# Altium schematic symbol library Electronic Devices_LIB.SchLib: 703 symbols (part 7 of 8) (continued)
## RES_301K_1%_100mW_0402 (continued)
SMD Chip Resistor, 301 kOhm, ± 1%, 100 mW, 0402 [1005 Metric], Thick Film, Precision; Manufacturer: Panasonic; Power Rating: 100mW; Voltage Rating: 50V; Temperature Coefficient: 100ppm/°C; Supplier 1: Mouser; Manufacturer Part Number: ERJ-2RKF3013X; RoHS: Yes; Category: Chip SMD Resistors; Stock 1: 80695; Pricing 1: 1=0.1, 10=0.017, 50=0.017, 100=0.008, 1000=0.006, 10000=0.003 (USD); Mount: Surface Mount; Case Code (Metric): 1005; Case Code (Imperial): 0402; Contact Plating: Tin; Weight: 2.8E-05oz; Min Operating Temperature: -55°C; Max Operating Temperature: 155°C; Packaging: Tape and Reel; Package Quantity: 10000; Resistor Type: Thick Film; Number of Terminations: 2; Termination: SMD/SMT; Max Power Dissipation: 100mW; Voltage Rating (DC): 50V; Features: Automotive AEC-Q200; Series: ERJ; Resistance Tolerance: 1%; Length: 1mm; Width: 0.5mm; Height: 0.35mm; Ratings: AEC-Q200; RoHS Compliant: Yes; Reach SVHC Compliant: Unknown; Lead Free: 5697LeadFree; ComponentLink1URL: https://datasheet.ciiva.com/46388/426256-46388702.pdf?src-supplier=Element14; ComponentLink1Description: https://datasheet.ciiva.com/46388/426256-46388702.pdf?src-supplier=Element14; ComponentLink2URL: https://datasheet.ciiva.com/28531/1678782-28531429.pdf?src-supplier=Element14; ComponentLink2Description: https://datasheet.ciiva.com/28531/1678782-28531429.pdf?src-supplier=Element14; ComponentLink3URL: https://datasheet.ciiva.com/28683/1678782-28683161.pdf?src-supplier=Element14; ComponentLink3Description: https://datasheet.ciiva.com/28683/1678782-28683161.pdf?src-supplier=Element14; ComponentLink4URL: https://datasheet.ciiva.com/24161/aoa0000ce2-24161740.pdf?src-supplier=Mouser; ComponentLink4Description: https://datasheet.ciiva.com/24161/aoa0000ce2-24161740.pdf?src-supplier=Mouser; ComponentLink5URL: https://datasheet.ciiva.com/16771/70260748-16771500.pdf?src-supplier=Allied+Electronics; ComponentLink5Description: https://datasheet.ciiva.com/16771/70260748-16771500.pdf?src-supplier=Allied+Electronics; ComponentLink6URL: https://datasheet.ciiva.com/16780/70260748-16780326.pdf?src-supplier=Allied+Electronics; ComponentLink6Description: https://datasheet.ciiva.com/16780/70260748-16780326.pdf?src-supplier=Allied+Electronics; Supplier Part Number 1: 667-ERJ-2RKF3013X
footprint RES_0402_RESC1005X04N (Chip Resistor, 2-Leads, Body 1.02x0.53mm, IPC Medium Density)
pins: 1, 2

## RES_316K_1%_100mW_0402
designator R?, comment Tolerance: 1%  Resistance: 316K  Case/Package: 0402  (hidden comment: ERJ-2RKF3163X)
SMD Chip Resistor, 316 kOhm, ± 1%, 100 mW, 0402 [1005 Metric], Thick Film, Precision; Manufacturer: Panasonic; Power Rating: 100mW; Voltage Rating: 50V; Temperature Coefficient: 100ppm/°C; Supplier 1: Digikey; Manufacturer Part Number: ERJ-2RKF3163X; RoHS: Yes; Category: Chip SMD Resistors; Stock 1: 118400; Pricing 1: 1=0.1, 10=0.024, 50=0.0152, 100=0.0127, 500=0.00866, 1000=0.00746, 5000=0.00542, 10000=0.0048, 20000=0.00429, 30000=0.00402, 50000=0.00373, 100000=0.0034 (USD); Mount: Surface Mount; Case Code (Metric): 1005; Case Code (Imperial): 0402; Contact Plating: Tin; Min Operating Temperature: -55°C; Max Operating Temperature: 155°C; Packaging: Tape and Reel; Package Quantity: 1; Resistor Type: Thick Film; Number of Terminations: 2; Termination: SMD/SMT; Max Power Dissipation: 100mW; Voltage Rating (DC): 50V; Features: Automotive AEC-Q200; Series: ERJ; Resistance Tolerance: 1%; Length: 0.039inch; Width: 0.5mm; Height: 0.016inch; Ratings: AEC-Q200; Reach SVHC Compliant: No; Lead Free: Lead Free; RoHS Compliant: Yes; ComponentLink1URL: https://datasheet.ciiva.com/22663/1678782-22663805.pdf?src-supplier=Farnell; ComponentLink1Description: https://datasheet.ciiva.com/22663/1678782-22663805.pdf?src-supplier=Farnell; ComponentLink2URL: https://datasheet.ciiva.com/43467/1678782-43467525.pdf?src-supplier=Farnell; ComponentLink2Description: https://datasheet.ciiva.com/43467/1678782-43467525.pdf?src-supplier=Farnell; ComponentLink3URL: https://datasheet.ciiva.com/9183/aoa0000ce2-9183095.pdf?src-supplier=Avnet; ComponentLink3Description: https://datasheet.ciiva.com/9183/aoa0000ce2-9183095.pdf?src-supplier=Avnet; ComponentLink4URL: https://datasheet.ciiva.com/30180/aoa0000ce2-30180486.pdf?src-supplier=Onlinecomponents.com; ComponentLink4Description: https://datasheet.ciiva.com/30180/aoa0000ce2-30180486.pdf?src-supplier=Onlinecomponents.com; ComponentLink5URL: https://datasheet.ciiva.com/16761/70260748-16761806.pdf?src-supplier=Allied+Electronics; ComponentLink5Description: https://datasheet.ciiva.com/16761/70260748-16761806.pdf?src-supplier=Allied+Electronics; ComponentLink6URL: https://datasheet.ciiva.com/16762/70260748-16762152.pdf?src-supplier=Allied+Electronics; ComponentLink6Description: https://datasheet.ciiva.com/16762/70260748-16762152.pdf?src-supplier=Allied+Electronics; ComponentLink7URL: https://datasheet.ciiva.com/46373/1678782-46373322.pdf?src-supplier=Element14; ComponentLink7Description: https://datasheet.ciiva.com/46373/1678782-46373322.pdf?src-supplier=Element14; ComponentLink8URL: https://datasheet.ciiva.com/46373/1678782-46373323.pdf?src-supplier=Element14; ComponentLink8Description: https://datasheet.ciiva.com/46373/1678782-46373323.pdf?src-supplier=Element14; ComponentLink9URL: https://datasheet.ciiva.com/24070/aoa0000ce2-24070773.pdf?src-supplier=Mouser; ComponentLink9Description: https://datasheet.ciiva.com/24070/aoa0000ce2-24070773.pdf?src-supplier=Mouser; ComponentLink10URL: https://datasheet.ciiva.com/28564/1694929-28564143.pdf?src-supplier=Element14; ComponentLink10Description: https://datasheet.ciiva.com/28564/1694929-28564143.pdf?src-supplier=Element14; ComponentLink11URL: https://datasheet.ciiva.com/7853/aoa0000ce2-7853694.pdf?src-supplier=Element14; ComponentLink11Description: https://datasheet.ciiva.com/7853/aoa0000ce2-7853694.pdf?src-supplier=Element14; Supplier Part Number 1: P316KLCT-ND
footprint RES_0402_RESC1005X04N (Chip Resistor, 2-Leads, Body 1.02x0.53mm, IPC Medium Density)
pins: 1, 2

## RES_324K_1%_100mW_0402
designator R?, comment Tolerance: 1%  Resistance: 324K  Case/Package: 0402  (hidden comment: RK73H1ETTP3243F)
Res Thick Film 0402 324K Ohm 1% 0.1W(1/10W) ±100ppm/C Pad SMD Automotive T/R; Manufacturer: KOA Speer; Power Rating: 63mW; Voltage Rating: 50V; Temperature Coefficient: 100ppm/°C; Supplier 1: Mouser; Manufacturer Part Number: RK73H1ETTP3243F; RoHS: Yes; Category: Chip SMD Resistors; Stock 1: 20274; Pricing 1: 1=0.1, 10=0.014, 50=0.014, 100=0.008, 1000=0.006, 10000=0.003 (USD); Case Code (Imperial): 0402; Case Code (Metric): 1005; Min Operating Temperature: -55°C; Max Operating Temperature: 155°C; Packaging: Tape and Reel; Package Quantity: 10000; Termination: SMD/SMT; Voltage Rating (DC): 50V; Series: RK73H; Construction: Rectangular; Length: 1mm; Width: 0.5mm; Height: 0.35mm; Depth: 0.5mm; Military Standard: MIL-R-55342F; Lead Free: Lead Free; RoHS Compliant: Yes; ComponentLink1URL: https://datasheet.ciiva.com/5557/rk73h-5557606.pdf?src-supplier=Mouser; ComponentLink1Description: https://datasheet.ciiva.com/5557/rk73h-5557606.pdf?src-supplier=Mouser; Supplier Part Number 1: 660-RK73H1ETTP3243F
footprint RES_0402_RESC1005X04N (Chip Resistor, 2-Leads, Body 1.02x0.53mm, IPC Medium Density)
pins: 1, 2

## RES_330R_5%_100mW_0603
designator R?, comment Tolerance: 5%  Resistance: 330R  Case/Package: 0603  (hidden comment: ERJ-3GEYJ331V)
Res Thick Film 0603 330 Ohm 5% 0.1W(1/10W) ±200ppm/C Pad SMD Automotive T/R; Manufacturer: Panasonic; Power Rating: 100mW; Voltage Rating: 75V; Temperature Coefficient: 200ppm/°C; Supplier 1: Digikey; Manufacturer Part Number: ERJ-3GEYJ331V; RoHS: Yes; Category: Chip SMD Resistors; Stock 1: 347982; Pricing 1: 1=0.1, 10=0.028, 50=0.018, 100=0.0152, 500=0.01044, 1000=0.00902 (USD); Mount: Surface Mount; Number of Pins: 2; Case Code (Metric): 1608; Case Code (Imperial): 0603; Contact Plating: Tin; Weight: 7.1E-05oz; Size Code: 0603; Min Operating Temperature: -55°C; Max Operating Temperature: 155°C; Packaging: Tape and Reel; Package Quantity: 1; Resistor Type: Thick Film; Number of Terminations: 2; Termination: SMD/SMT; Max Power Dissipation: 100mW; Voltage Rating (DC): 75V; Features: Automotive AEC-Q200; Series: ERJ; Resistance Tolerance: 5%; Technology: THICK FILM; Construction: Rectangular; Length: 1.6mm; Width: 0.8mm; Height: 0.45mm; Depth: 0.8mm; Ratings: AEC-Q200; Radiation Hardening: No; Reach SVHC Compliant: No; Military Standard: Not; Lead Free: Lead Free; RoHS Compliant: Yes; Supplier Part Number 1: P330GCT-ND
footprint RES_0603_RESC1608X04N (Chip Resistor, 2-Leads, Body 1.60x0.80mm, IPC Medium Density)
pins: 1, 2

## RES_348K_1%_100mW_0603
designator R?, comment Tolerance: 1%  Resistance: 348K  Case/Package: 0603  (hidden comment: RC0603FR-07348KL)
Res Thick Film 0603 348K Ohm 1% 0.1W(1/10W) ±100ppm/°C Pad SMD T/R; Manufacturer: Yageo; Power Rating: 100mW; Voltage Rating: 50V; Manufacturer Part Number: RC0603FR-07348KL; RoHS: Yes; Category: Chip SMD Resistors; Stock 1: 335280; Pricing 1: 1=0.10000, 10=0.01900, 100=0.00770, 1000=0.00345, 2500=0.00300 (USD); Case Code (Metric): 1608; Case Code (Imperial): 0603; Size Code: 0603; Min Operating Temperature: -55°C; Max Operating Temperature: 155°C; Package Quantity: 1; Termination: SMD/SMT; Series: RC; Packaging: Tape and Reel; Resistor Type: Thick Film; Number of Terminations: 2; Max Power Dissipation: 100mW; Temperature Coefficient: 100ppm/°C; Voltage Rating (DC): 50V; Features: Moisture Resistant; Construction: Rectangular; Length: 0.063inch; Width: 0.031inch; Height: 0.022inch; Depth: 0.8mm; RoHS Compliant: Yes; Military Standard: Not; Lead Free: Lead Free; ComponentLink1URL: https://datasheet.ciiva.com/2454/pyu-r-int-thick-7-2454868.pdf?src-supplier=Digi-Key; ComponentLink1Description: https://datasheet.ciiva.com/2454/pyu-r-int-thick-7-2454868.pdf?src-supplier=Digi-Key; ComponentLink2URL: https://datasheet.ciiva.com/2454/pyu-r-int-thick-7-2454869.pdf?src-supplier=Digi-Key; ComponentLink2Description: https://datasheet.ciiva.com/2454/pyu-r-int-thick-7-2454869.pdf?src-supplier=Digi-Key; ComponentLink3URL: https://datasheet.ciiva.com/2454/pyu-r-int-thick-7-2454867.pdf?src-supplier=Digi-Key; ComponentLink3Description: https://datasheet.ciiva.com/2454/pyu-r-int-thick-7-2454867.pdf?src-supplier=Digi-Key; Supplier 1: Digi-Key; Supplier 2: Newark; Supplier 3: Verical; Supplier Part Number 1: 311-348KHRCT-ND; Supplier Part Number 2: 49AK2034; Supplier Part Number 3: RC0603FR-07348KL
footprint RES_0603_RESC1608X04N (Chip Resistor, 2-Leads, Body 1.60x0.80mm, IPC Medium Density)
pins: 1, 2

## RES_360K_1%_100mW_0402
designator R?, comment RK73H1ETTP3603F  Tolerance: 1%  Resistance: 360K  Case/Package: 0402
Res Thick Film 0402 360K Ohm 1% 0.1W(1/10W) ±100ppm/C Pad SMD Automotive T/R; Manufacturer: KOA Speer; Power Rating: 63mW; Supplier 1: Digi-Key; Manufacturer Part Number: RK73H1ETTP3603F; RoHS: Yes; Category: Chip SMD Resistors; Stock 1: 48950; Pricing 1: 1=0.1, 10=0.021, 50=0.0134, 100=0.0112, 500=0.00764, 1000=0.00658, 5000=0.00478 (USD); Min Operating Temperature: -55°C; Max Operating Temperature: 155°C; Construction: Rectangular; Length: 1mm; Depth: 0.5mm; Military Standard: Not; Lead Free: Lead Free; RoHS Compliant: Yes; Supplier Part Number 1: 2019-RK73H1ETTP3603FCT-ND
footprint RES_0402_RESC1005X04N (Chip Resistor, 2-Leads, Body 1.02x0.53mm, IPC Medium Density)
pins: 1, 2

## RES_383K_1%_100mW_0402
designator R?, comment Tolerance: 1%  Resistance: 383K  Case/Package: 0402  (hidden comment: ERJ-2RKF3833X)
SMD Chip Resistor, 383 kOhm, ± 1%, 100 mW, 0402 [1005 Metric], Thick Film, Precision; Manufacturer: Panasonic; Power Rating: 100mW; Voltage Rating: 50V; Temperature Coefficient: 100ppm/°C; Supplier 1: Mouser; Manufacturer Part Number: ERJ-2RKF3833X; RoHS: Yes; Category: Chip SMD Resistors; Stock 1: 60258; Pricing 1: 1=0.1, 10=0.015, 50=0.015, 100=0.009, 1000=0.006, 10000=0.003 (USD); Mount: Surface Mount; Case Code (Imperial): 0402; Case Code (Metric): 1005; Contact Plating: Tin; Size Code: 0402; Min Operating Temperature: -55°C; Max Operating Temperature: 155°C; Package Quantity: 10000; Packaging: Tape and Reel; Termination: SMD/SMT; Resistor Type: Thick Film; Number of Terminations: 2; Max Power Dissipation: 100mW; Voltage Rating (DC): 50V; Features: Automotive AEC-Q200; Series: ERJ; Resistance Tolerance: 1%; Technology: THICK FILM; Construction: Rectangular; Length: 1mm; Width: 0.5mm; Height: 0.35mm; Depth: 0.5mm; Ratings: AEC-Q200; Reach SVHC Compliant: No; Military Standard: Not; Lead Free: Lead Free; RoHS Compliant: Yes; ComponentLink1URL: https://datasheet.ciiva.com/9182/aoa0000ce2-9182444.pdf?src-supplier=Avnet; ComponentLink1Description: https://datasheet.ciiva.com/9182/aoa0000ce2-9182444.pdf?src-supplier=Avnet; ComponentLink2URL: https://datasheet.ciiva.com/43467/1678782-43467535.pdf?src-supplier=Farnell; ComponentLink2Description: https://datasheet.ciiva.com/43467/1678782-43467535.pdf?src-supplier=Farnell; ComponentLink3URL: https://datasheet.ciiva.com/30158/aoa0000ce2-30158936.pdf?src-supplier=Onlinecomponents.com; ComponentLink3Description: https://datasheet.ciiva.com/30158/aoa0000ce2-30158936.pdf?src-supplier=Onlinecomponents.com; ComponentLink4URL: https://datasheet.ciiva.com/16440/aoa0000ce2-16440223.pdf?src-supplier=Future+Electronics; ComponentLink4Description: https://datasheet.ciiva.com/16440/aoa0000ce2-16440223.pdf?src-supplier=Future+Electronics; Supplier Part Number 1: 667-ERJ-2RKF3833X
footprint RES_0402_RESC1005X04N (Chip Resistor, 2-Leads, Body 1.02x0.53mm, IPC Medium Density)
pins: 1, 2

## RES_402R_1%_100mW_0402
designator R?, comment CRCW0603402RFKEA  Tolerance: 1%  Resistance: 402R  Case/Package: 0603
CRCW Series 0603 0.1 W 402 Ohm ±1 % ±100 ppm/K SMT Thick Film Chip Resistor; Manufacturer: Vishay; Power Rating: 100mW; Voltage Rating: 75V; Temperature Coefficient: 100ppm/°C; Supplier 1: Mouser; Manufacturer Part Number: CRCW0603402RFKEA; RoHS: Yes; Category: Chip SMD Resistors; Stock 1: 16183; Pricing 1: 1=0.1, 10=0.017, 50=0.017, 100=0.01, 1000=0.008, 10000=0.004 (USD); Number of Pins: 2; Weight: 7.1E-05oz; Case Code (Metric): 1608; Case Code (Imperial): 0603; Contact Plating: Tin; Size Code: 0603; Min Operating Temperature: -55°C; Max Operating Temperature: 155°C; Packaging: Tape and Reel; Package Quantity: 10; Number of Terminations: 2; Termination: SMD/SMT; Max Power Dissipation: 100mW; Features: Automotive AEC-Q200; Series: CRCW; Resistor Type: Thick Film; Voltage Rating (DC): 75V; Resistance Tolerance: 1%; Construction: Rectangular; Technology: THICK FILM; Length: 1.55mm; Width: 0.033inch; Height: 0.45mm; Depth: 0.85mm; Radiation Hardening: No; Lead Free: Lead Free; RoHS Compliant: Yes; Military Standard: Not; Reach SVHC Compliant: Unknown; ComponentLink1URL: https://datasheet.ciiva.com/11811/0900766b80d98afc-11811706.pdf?src-supplier=Rs; ComponentLink1Description: https://datasheet.ciiva.com/11811/0900766b80d98afc-11811706.pdf?src-supplier=Rs; ComponentLink2URL: https://datasheet.ciiva.com/2465/dcrcwe3-2465870.pdf?src-supplier=Digikey; ComponentLink2Description: https://datasheet.ciiva.com/2465/dcrcwe3-2465870.pdf?src-supplier=Digikey; ComponentLink3URL: https://datasheet.ciiva.com/2465/dcrcwe3-2465871.pdf?src-supplier=Digikey; ComponentLink3Description: https://datasheet.ciiva.com/2465/dcrcwe3-2465871.pdf?src-supplier=Digikey; ComponentLink4URL: https://datasheet.ciiva.com/2465/dcrcwe3-2465872.pdf?src-supplier=Digikey; ComponentLink4Description: https://datasheet.ciiva.com/2465/dcrcwe3-2465872.pdf?src-supplier=Digikey; ComponentLink5URL: https://datasheet.ciiva.com/3257/dcrcwe3-3257562.pdf?src-supplier=Avnet; ComponentLink5Description: https://datasheet.ciiva.com/3257/dcrcwe3-3257562.pdf?src-supplier=Avnet; ComponentLink6URL: https://datasheet.ciiva.com/3257/dcrcwe3-3257563.pdf?src-supplier=Avnet; ComponentLink6Description: https://datasheet.ciiva.com/3257/dcrcwe3-3257563.pdf?src-supplier=Avnet; ComponentLink7URL: https://datasheet.ciiva.com/7881/1697337-7881913.pdf?src-supplier=Element14; ComponentLink7Description: https://datasheet.ciiva.com/7881/1697337-7881913.pdf?src-supplier=Element14; ComponentLink8URL: https://datasheet.ciiva.com/7881/1697337-7881914.pdf?src-supplier=Element14; ComponentLink8Description: https://datasheet.ciiva.com/7881/1697337-7881914.pdf?src-supplier=Element14; ComponentLink9URL: https://datasheet.ciiva.com/22705/1697337-22705175.pdf?src-supplier=Element14; ComponentLink9Description: https://datasheet.ciiva.com/22705/1697337-22705175.pdf?src-supplier=Element14; ComponentLink10URL: https://datasheet.ciiva.com/22871/70201119-22871855.pdf?src-supplier=Allied+Electronics; ComponentLink10Description: https://datasheet.ciiva.com/22871/70201119-22871855.pdf?src-supplier=Allied+Electronics; Supplier Part Number 1: 71-CRCW0603-402-E3
footprint RES_0603_RESC1608X04N (Chip Resistor, 2-Leads, Body 1.60x0.80mm, IPC Medium Density)
pins: 1, 2

## RES_430R_0.1%_100mW_0603
designator R?, comment Tolerance: 0.1%  Case/Packcage: 0603  Resistence: 430R  (hidden comment: RT0603BRD07430RL)
Res Thin Film 0603 430 Ohm 0.1% 1/10W ±25ppm/°C Molded SMD SMD Paper T/R; Manufacturer: Yageo; Power Rating: 100mW; Voltage Rating: 75V; Voltage Rating (DC): 50V; Supplier 1: Digi-Key; Manufacturer Part Number: RT0603BRD07430RL; RoHS: Yes; Category: Chip SMD Resistors; Stock 1: 14520; Pricing 1: 1=0.34000, 10=0.28800, 100=0.11260, 500=0.06812, 1000=0.04716, 2500=0.04322 (USD); Case Code (Metric): 1608; Case Code (Imperial): 0603; Contact Plating: Tin,Matte; Min Operating Temperature: -55°C; Max Operating Temperature: 125°C; Packaging: Tape and Reel; Package Quantity: 5000; Resistor Type: Thin Film; Number of Terminations: 2; Termination: SMD/SMT; Max Power Dissipation: 100mW; Temperature Coefficient: 25ppm/°C; Features: Moisture Resistant; Series: RT; Length: 0.063inch; Width: 0.031inch; Height: 0.022inch; Radiation Hardening: No; Lead Free: Lead Free; RoHS Compliant: Yes; ComponentLink1URL: https://datasheet.ciiva.com/8885/pyu-rt-1-to-0-05-rohs-l-4-8885723.pdf?src-supplier=Avnet; ComponentLink1Description: https://datasheet.ciiva.com/8885/pyu-rt-1-to-0-05-rohs-l-4-8885723.pdf?src-supplier=Avnet; ComponentLink2URL: https://datasheet.ciiva.com/2585/pyu-rt-1-to-0-05-rohs-l-4-2585946.pdf?src-supplier=Digi-Key; ComponentLink2Description: https://datasheet.ciiva.com/2585/pyu-rt-1-to-0-05-rohs-l-4-2585946.pdf?src-supplier=Digi-Key; ComponentLink3URL: https://datasheet.ciiva.com/46635/pyu-rt-1-to-0-05-rohs-l-5-46635290.pdf?src-supplier=Digi-Key; ComponentLink3Description: https://datasheet.ciiva.com/46635/pyu-rt-1-to-0-05-rohs-l-5-46635290.pdf?src-supplier=Digi-Key; ComponentLink4URL: https://datasheet.ciiva.com/12706/pyu-rt-1-to-0-05-rohs-l-4-12706729.pdf?src-supplier=Mouser; ComponentLink4Description: https://datasheet.ciiva.com/12706/pyu-rt-1-to-0-05-rohs-l-4-12706729.pdf?src-supplier=Mouser; Supplier Part Number 1: YAG1660DKR-ND
footprint RES_0603_RESC1608X04N (Chip Resistor, 2-Leads, Body 1.60x0.80mm, IPC Medium Density)
pins: 1, 2

## RES_470R_1%_100mW_0603
designator R?, comment Tolerance: 1%  Resistance: 470R  Case/Package: 0603  (hidden comment: RC0603FR-07470RL)
SMD Chip Resistor, 470 Ohm, ± 1%, 100 mW, 0603 [1608 Metric], Thick Film, General Purpose; Manufacturer: Yageo; Power Rating: 100mW; Voltage Rating: 50V; Temperature Coefficient: 100ppm/°C; Working Voltage: 75V; Impedance: 50R; Supplier 1: Digikey; Manufacturer Part Number: RC0603FR-07470RL; RoHS: Yes; Category: Chip SMD Resistors; Stock 1: 395293; Pricing 1: 1=0.1, 10=0.019, 50=0.0112, 100=0.0093, 500=0.00622, 1000=0.00532 (USD); Case Code (Metric): 1608; Case Code (Imperial): 0603; Contact Material: 152ConductorMaterial; Contact Plating: 157ConductorMaterial; Min Operating Temperature: -55°C; Max Operating Temperature: 155°C; Packaging: Tape and Reel; Package Quantity: 1; Resistor Type: Thick Film; Number of Terminations: 2; Termination: SMD/SMT; Max Power Dissipation: 100mW; Features: Moisture Resistant; Series: RC; Technology: THICK FILM; Resistance Tolerance: 1%; Length: 0.063inch; Width: 0.031inch; Height: 0.022inch; Depth: 0.8mm; Radiation Hardening: 5898YesNo; RoHS Compliant: Yes; Reach SVHC Compliant: No; Lead Free: Lead Free; ComponentLink1URL: https://datasheet.ciiva.com/11808/0900766b80f96399-11808177.pdf?src-supplier=Rs; ComponentLink1Description: https://datasheet.ciiva.com/11808/0900766b80f96399-11808177.pdf?src-supplier=Rs; ComponentLink2URL: https://datasheet.ciiva.com/7660/1868787-7660793.pdf?src-supplier=Element14; ComponentLink2Description: https://datasheet.ciiva.com/7660/1868787-7660793.pdf?src-supplier=Element14; ComponentLink3URL: https://datasheet.ciiva.com/46440/1868787-46440907.pdf?src-supplier=Element14; ComponentLink3Description: https://datasheet.ciiva.com/46440/1868787-46440907.pdf?src-supplier=Element14; ComponentLink4URL: https://datasheet.ciiva.com/2454/pyu-r-int-thick-7-2454013.pdf?src-supplier=Digikey; ComponentLink4Description: https://datasheet.ciiva.com/2454/pyu-r-int-thick-7-2454013.pdf?src-supplier=Digikey; ComponentLink5URL: https://datasheet.ciiva.com/2454/pyu-r-int-thick-7-2454014.pdf?src-supplier=Digikey; ComponentLink5Description: https://datasheet.ciiva.com/2454/pyu-r-int-thick-7-2454014.pdf?src-supplier=Digikey; ComponentLink6URL: https://datasheet.ciiva.com/2454/pyu-r-int-thick-7-2454012.pdf?src-supplier=Digikey; ComponentLink6Description: https://datasheet.ciiva.com/2454/pyu-r-int-thick-7-2454012.pdf?src-supplier=Digikey; ComponentLink7URL: https://datasheet.ciiva.com/7746/1738695-7746359.pdf?src-supplier=Element14; ComponentLink7Description: https://datasheet.ciiva.com/7746/1738695-7746359.pdf?src-supplier=Element14; ComponentLink8URL: https://datasheet.ciiva.com/7746/1738695-7746360.pdf?src-supplier=Element14; ComponentLink8Description: https://datasheet.ciiva.com/7746/1738695-7746360.pdf?src-supplier=Element14; Supplier Part Number 1: 311-470HRCT-ND
footprint RES_0603_RESC1608X04N (Chip Resistor, 2-Leads, Body 1.60x0.80mm, IPC Medium Density)
pins: 1, 2

## RES_499K_1%_100mW_0402
designator R?, comment Resistance: 499K  Tolerance: 1%  Case/Package: 0402  (hidden comment: ERJ-2RKF4993X)
Res Thick Film 0402 499K Ohm 1% 0.1W ±100ppm/°C Molded SMD Punched Carrier T/R; Manufacturer: Panasonic; Power Rating: 100mW; Voltage Rating: 50V; Supplier 1: Digikey; Manufacturer Part Number: ERJ-2RKF4993X; RoHS: Yes; Category: Chip SMD Resistors; Stock 1: 791196; Pricing 1: 1=0.1, 10=0.024, 50=0.0152, 100=0.0125, 500=0.0084, 1000=0.0072, 5000=0.00523 (USD); Mount: Surface Mount; Number of Pins: 2; Case Code (Imperial): 0402; Case Code (Metric): 1005; Weight: 2.8E-05oz; Contact Plating: Tin; Min Operating Temperature: -55°C; Max Operating Temperature: 155°C; Packaging: Tape and Reel; Package Quantity: 1; Resistor Type: Thick Film; Termination: SMD/SMT; Number of Terminations: 2; Temperature Coefficient: 100ppm/°C; Max Power Dissipation: 100mW; Voltage Rating (DC): 50V; Features: Automotive AEC-Q200; Series: ERJ; Resistance Tolerance: 1%; Construction: Rectangular; Length: 1mm; Width: 0.5mm; Height: 0.016inch; Depth: 0.5mm; Military Standard: Not; Lead Free: Lead Free; RoHS Compliant: Yes; Reach SVHC Compliant: Unknown; ComponentLink1URL: https://datasheet.ciiva.com/5951/426256-5951322.pdf?src-supplier=Farnell; ComponentLink1Description: https://datasheet.ciiva.com/5951/426256-5951322.pdf?src-supplier=Farnell; ComponentLink2URL: https://datasheet.ciiva.com/43460/426256-43460346.pdf?src-supplier=Farnell; ComponentLink2Description: https://datasheet.ciiva.com/43460/426256-43460346.pdf?src-supplier=Farnell; ComponentLink3URL: https://datasheet.ciiva.com/9181/aoa0000ce2-9181509.pdf?src-supplier=Avnet; ComponentLink3Description: https://datasheet.ciiva.com/9181/aoa0000ce2-9181509.pdf?src-supplier=Avnet; ComponentLink4URL: https://datasheet.ciiva.com/9181/aoa0000ce2-9181513.pdf?src-supplier=Avnet; ComponentLink4Description: https://datasheet.ciiva.com/9181/aoa0000ce2-9181513.pdf?src-supplier=Avnet; ComponentLink5URL: https://datasheet.ciiva.com/16760/70260748-16760715.pdf?src-supplier=Allied+Electronics; ComponentLink5Description: https://datasheet.ciiva.com/16760/70260748-16760715.pdf?src-supplier=Allied+Electronics; ComponentLink6URL: https://datasheet.ciiva.com/28610/1678782-28610966.pdf?src-supplier=Element14; ComponentLink6Description: https://datasheet.ciiva.com/28610/1678782-28610966.pdf?src-supplier=Element14; ComponentLink7URL: https://datasheet.ciiva.com/28672/1678782-28672345.pdf?src-supplier=Element14; ComponentLink7Description: https://datasheet.ciiva.com/28672/1678782-28672345.pdf?src-supplier=Element14; ComponentLink8URL: https://datasheet.ciiva.com/46377/426256-46377753.pdf?src-supplier=Element14; ComponentLink8Description: https://datasheet.ciiva.com/46377/426256-46377753.pdf?src-supplier=Element14; Supplier Part Number 1: P499KLCT-ND
footprint RES_0402_RESC1005X04N (Chip Resistor, 2-Leads, Body 1.02x0.53mm, IPC Medium Density)
pins: 1, 2

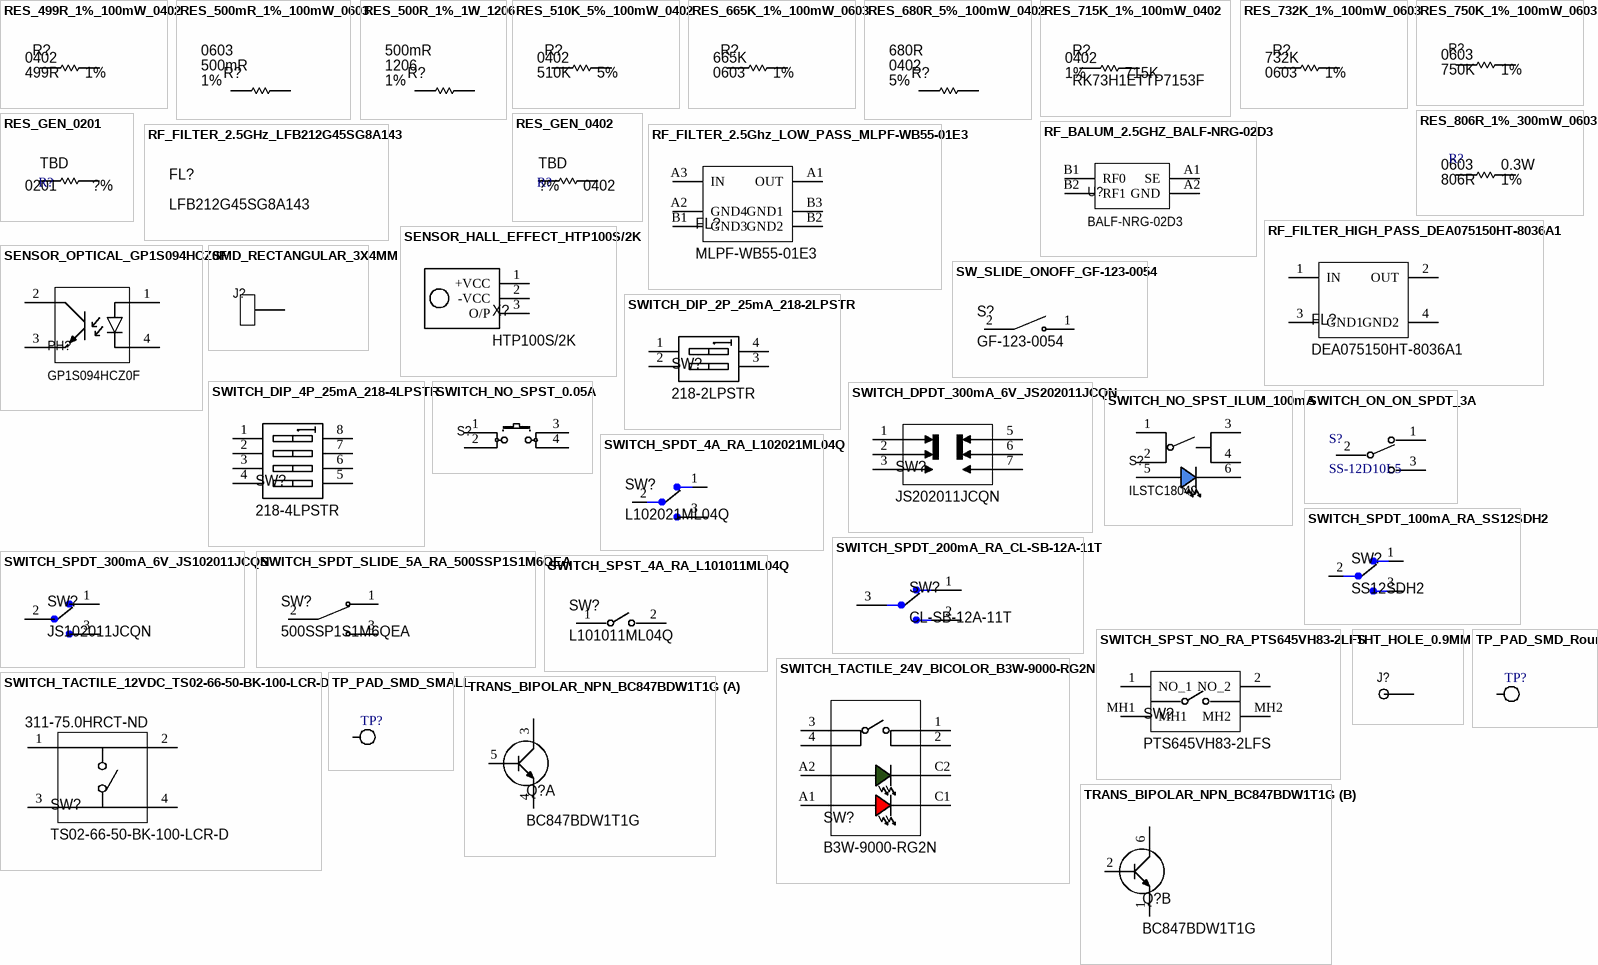
[diagram p35: symbols RES_499R_1%_100mW_0402 to TRANS_BIPOLAR_NPN_BC847BDW1T1G]

## RES_499R_1%_100mW_0402
designator R?, comment Tolerance: 1%  Resistance: 499R  Case/Package: 0402  (hidden comment: ERJ-2RKF4990X)
SMD Chip Resistor, 499 Ohm, ± 1%, 100 mW, 0402 [1005 Metric], Thick Film, Precision; Manufacturer: Panasonic; Power Rating: 100mW; Voltage Rating: 50V; Temperature Coefficient: 100ppm/°C; Supplier 1: Digi-Key; Manufacturer Part Number: ERJ-2RKF4990X; RoHS: Yes; Category: Chip SMD Resistors; Stock 1: 1881387; Pricing 1: 1=0.1, 10=0.024, 50=0.015, 100=0.0125, 500=0.00848, 1000=0.00731, 5000=0.00531 (USD); Mount: Surface Mount; Case Code (Metric): 1005; Case Code (Imperial): 0402; Contact Plating: Tin; Size Code: 0402; Min Operating Temperature: -55°C; Max Operating Temperature: 155°C; Packaging: Tape and Reel; Package Quantity: 1; Resistor Type: Thick Film; Number of Terminations: 2; Termination: SMD/SMT; Max Power Dissipation: 100mW; Voltage Rating (DC): 50V; Features: Automotive AEC-Q200; Series: ERJ; Resistance Tolerance: 1%; Technology: THICK FILM; Construction: Rectangular; Length: 1mm; Width: 0.5mm; Height: 0.35mm; Depth: 0.5mm; Reach SVHC Compliant: No; Lead Free: Lead Free; RoHS Compliant: Yes; Military Standard: Not; ComponentLink1URL: https://datasheet.ciiva.com/16766/70260748-16766015.pdf?src-supplier=Allied+Electronics; ComponentLink1Description: https://datasheet.ciiva.com/16766/70260748-16766015.pdf?src-supplier=Allied+Electronics; ComponentLink2URL: https://datasheet.ciiva.com/16765/70260748-16765054.pdf?src-supplier=Allied+Electronics; ComponentLink2Description: https://datasheet.ciiva.com/16765/70260748-16765054.pdf?src-supplier=Allied+Electronics; ComponentLink3URL: https://datasheet.ciiva.com/16508/aoa0000ce2-16508382.pdf?src-supplier=Future+Electronics; ComponentLink3Description: https://datasheet.ciiva.com/16508/aoa0000ce2-16508382.pdf?src-supplier=Future+Electronics; Supplier Part Number 1: P499LCT-ND
footprint RES_0402_RESC1005X04N (Chip Resistor, 2-Leads, Body 1.02x0.53mm, IPC Medium Density)
pins: 1, 2

## RES_500mR_1%_100mW_0603
designator R?, comment Tolerance: 1%  Resistance: 500mR  Case/Package: 0603  (hidden comment: RL0603FR-070R5L)
SMD Chip Resistor, 500 MOhm, ± 1%, 100 mW, 0603 [1608 Metric], Thick Film, Low Ohmic; Manufacturer: Yageo; Power Rating: 100mW; Voltage Rating: 100V; Temperature Coefficient: 800ppm/°C; Supplier 1: Digikey; Manufacturer Part Number: RL0603FR-070R5L; RoHS: Yes; Category: Chip SMD Resistors; Stock 1: 45676; Pricing 1: 1=0.24, 10=0.088, 50=0.0714, 100=0.0495, 500=0.04386 (USD); Case Code (Imperial): 0603; Case Code (Metric): 1608; Size Code: 0603; Min Operating Temperature: -55°C; Max Operating Temperature: 155°C; Packaging: Tape and Reel; Termination: SMD/SMT; Features: Moisture Resistant,Automotive AEC-Q200; Series: RL; Max Power Dissipation: 100mW; Number of Terminations: 2; Length: 1.6mm; Width: 0.8mm; Height: 0.45mm; Ratings: AEC-Q200; Lead Free: Lead Free; RoHS Compliant: Yes; ComponentLink1URL: https://datasheet.ciiva.com/5558/pyu-rl-521-rohs-l-5-5558165.pdf?src-supplier=Mouser; ComponentLink1Description: https://datasheet.ciiva.com/5558/pyu-rl-521-rohs-l-5-5558165.pdf?src-supplier=Mouser; Supplier Part Number 1: 311-.5QCT-ND
footprint RES_0603_RESC1608X04N (Chip Resistor, 2-Leads, Body 1.60x0.80mm, IPC Medium Density)
pins: 1, 2

## RES_500R_1%_1W_1206
designator R?, comment Tolerance: 1%  Packcage: 1206  Resistance: 500mR  (hidden comment: MFHA1206R5000FC)
Resistor Current Sense Metal Film 1206 500m Ohm 1% 1W ±100ppm/°C T/R; Manufacturer: Eaton; Supplier 1: Digikey; Manufacturer Part Number: MFHA1206R5000FC; RoHS: No; Category: Chip SMD Resistors; Stock 1: 23715; Pricing 1: 1=0.34, 10=0.187, 25=0.15, 50=0.1278, 100=0.1093, 250=0.08956, 500=0.07752, 1000=0.06747, 5000=0.05002, 10000=0.04446, 15000=0.04163, 25000=0.04 (USD); Temperature Coefficient: 100ppm/°C; Supplier Part Number 1: 283-MFHA1206R5000FCCT-ND
footprint RES_1206_RESC3216X65N (RES SMD 1206)
pins: 1, 2

## RES_510K_5%_100mW_0402
designator R?, comment Tolerance: 5%  Resistance: 510K  Case/Package: 0402  (hidden comment: ERJ-2GEJ514X)
SMD Chip Resistor, 510 kOhm, ± 5%, 100 mW, 0402 [1005 Metric], Thick Film, General Purpose; Manufacturer: Panasonic; Power Rating: 100mW; Voltage Rating: 50V; Temperature Coefficient: 200ppm/°C; Supplier 1: Digikey; Manufacturer Part Number: ERJ-2GEJ514X; RoHS: Yes; Category: Chip SMD Resistors; Stock 1: 171465; Pricing 1: 1=0.1, 10=0.022, 50=0.0134, 100=0.0112, 500=0.00758, 1000=0.00651, 5000=0.00473 (USD); Mount: Surface Mount; Case Code (Imperial): 0402; Case Code (Metric): 1005; Weight: 2.8E-05oz; Contact Plating: Tin; Min Operating Temperature: -55°C; Max Operating Temperature: 155°C; Packaging: Tape and Reel; Package Quantity: 10000; Resistor Type: Thick Film; Number of Terminations: 2; Max Power Dissipation: 100mW; Voltage Rating (DC): 50V; Features: Automotive AEC-Q200; Series: ERJ; Resistance Tolerance: 5%; Termination: SMD/SMT; Construction: Rectangular; Technology: THICK FILM; Length: 1mm; Width: 0.5mm; Height: 0.35mm; Depth: 0.5mm; Ratings: AEC-Q200; Radiation Hardening: No; Reach SVHC Compliant: No; Lead Free: Lead Free; RoHS Compliant: Yes; Military Standard: Not; ComponentLink1URL: https://datasheet.ciiva.com/11821/0900766b80f806dd-11821324.pdf?src-supplier=Rs; ComponentLink1Description: https://datasheet.ciiva.com/11821/0900766b80f806dd-11821324.pdf?src-supplier=Rs; ComponentLink2URL: https://datasheet.ciiva.com/30121/4aoa0000ce1-30121622.pdf?src-supplier=Onlinecomponents.com; ComponentLink2Description: https://datasheet.ciiva.com/30121/4aoa0000ce1-30121622.pdf?src-supplier=Onlinecomponents.com; ComponentLink3URL: https://datasheet.ciiva.com/8079/1678796-8079437.pdf?src-supplier=Element14; ComponentLink3Description: https://datasheet.ciiva.com/8079/1678796-8079437.pdf?src-supplier=Element14; Supplier Part Number 1: P510KJCT-ND
footprint RES_0402_RESC1005X04N (Chip Resistor, 2-Leads, Body 1.02x0.53mm, IPC Medium Density)
pins: 1, 2

## RES_665K_1%_100mW_0603
designator R?, comment Resistance: 665K  Tolerance: 1%  Case/Package: 0603  (hidden comment: ERJ-3EKF6653V)
SMD Chip Resistor, 665 kOhm, ± 1%, 100 mW, 0603 [1608 Metric], Thick Film, Precision; Manufacturer: Panasonic; Power Rating: 100mW; Voltage Rating: 75V; Temperature Coefficient: 100ppm/°C; Voltage Rating (DC): 50V; Supplier 1: Digikey; Manufacturer Part Number: ERJ-3EKF6653V; RoHS: Yes; Category: Chip SMD Resistors; Stock 1: 43691; Pricing 1: 1=0.1, 10=0.03, 50=0.0194, 100=0.0163, 500=0.01132, 1000=0.0098 (USD); Mount: Surface Mount; Case Code (Metric): 1608; Case Code (Imperial): 0603; Contact Plating: Tin; Min Operating Temperature: -55°C; Max Operating Temperature: 155°C; Packaging: Tape and Reel; Package Quantity: 5000; Resistor Type: Thick Film; Number of Terminations: 2; Termination: SMD/SMT; Max Power Dissipation: 100mW; Features: Automotive AEC-Q200; Series: ERJ; Construction: Rectangular; Resistance Tolerance: 1%; Length: 1.6mm; Width: 0.8mm; Height: 0.022inch; Depth: 0.8mm; Reach SVHC Compliant: Yes; Military Standard: Not; RoHS Compliant: Yes; ComponentLink1URL: https://datasheet.ciiva.com/9180/aoa0000ce2-9180543.pdf?src-supplier=Avnet; ComponentLink1Description: https://datasheet.ciiva.com/9180/aoa0000ce2-9180543.pdf?src-supplier=Avnet; ComponentLink2URL: https://datasheet.ciiva.com/7754/1678782-7754015.pdf?src-supplier=Element14; ComponentLink2Description: https://datasheet.ciiva.com/7754/1678782-7754015.pdf?src-supplier=Element14; ComponentLink3URL: https://datasheet.ciiva.com/22668/1678782-22668429.pdf?src-supplier=Element14; ComponentLink3Description: https://datasheet.ciiva.com/22668/1678782-22668429.pdf?src-supplier=Element14; ComponentLink4URL: https://datasheet.ciiva.com/46420/1678782-46420005.pdf?src-supplier=Element14; ComponentLink4Description: https://datasheet.ciiva.com/46420/1678782-46420005.pdf?src-supplier=Element14; Supplier Part Number 1: P665KHCT-ND
footprint RES_0603_RESC1608X04N (Chip Resistor, 2-Leads, Body 1.60x0.80mm, IPC Medium Density)
pins: 1, 2

## RES_680R_5%_100mW_0402
designator R?, comment Tolerance: 5%  Resistance: 680R  Case/Package: 0402  (hidden comment: ERJ-2GEJ681X)
SMD Chip Resistor, 680 Ohm, ± 5%, 100 mW, 0402 [1005 Metric], Thick Film, General Purpose; Manufacturer: Panasonic; Voltage Rating: 50V; Power Rating: 100mW; Temperature Coefficient: 200ppm/°C; Supplier 1: Digikey; Manufacturer Part Number: ERJ-2GEJ681X; RoHS: Yes; Category: Chip SMD Resistors; Stock 1: 172084; Pricing 1: 1=0.1, 10=0.022, 50=0.0134, 100=0.0111, 500=0.00742, 1000=0.00635, 5000=0.00459 (USD); Mount: Surface Mount; Case Code (Metric): 1005; Case Code (Imperial): 0402; Contact Plating: Tin; Min Operating Temperature: -55°C; Max Operating Temperature: 155°C; Packaging: Tape and Reel; Package Quantity: 10000; Resistor Type: Thick Film; Number of Terminations: 2; Termination: SMD/SMT; Max Power Dissipation: 100mW; Voltage Rating (DC): 50V; Features: Automotive AEC-Q200; Series: ERJ; Technology: THICK FILM; Resistance Tolerance: 5%; Length: 1mm; Width: 0.5mm; Height: 0.35mm; Depth: 0.5mm; Ratings: AEC-Q200; Reach SVHC Compliant: No; RoHS Compliant: Yes; ComponentLink1URL: https://datasheet.ciiva.com/11821/0900766b80f806dd-11821377.pdf?src-supplier=Rs; ComponentLink1Description: https://datasheet.ciiva.com/11821/0900766b80f806dd-11821377.pdf?src-supplier=Rs; ComponentLink2URL: https://datasheet.ciiva.com/24071/aoa0000ce1-37422-24071113.pdf?src-supplier=Mouser; ComponentLink2Description: https://datasheet.ciiva.com/24071/aoa0000ce1-37422-24071113.pdf?src-supplier=Mouser; ComponentLink3URL: https://datasheet.ciiva.com/46389/1500035-46389758.pdf?src-supplier=Element14; ComponentLink3Description: https://datasheet.ciiva.com/46389/1500035-46389758.pdf?src-supplier=Element14; ComponentLink4URL: https://datasheet.ciiva.com/5860/1500035-5860647.pdf?src-supplier=Farnell; ComponentLink4Description: https://datasheet.ciiva.com/5860/1500035-5860647.pdf?src-supplier=Farnell; ComponentLink5URL: https://datasheet.ciiva.com/30051/4aoa0000ce1-30051469.pdf?src-supplier=Onlinecomponents.com; ComponentLink5Description: https://datasheet.ciiva.com/30051/4aoa0000ce1-30051469.pdf?src-supplier=Onlinecomponents.com; ComponentLink6URL: https://datasheet.ciiva.com/28590/1678796-28590759.pdf?src-supplier=Element14; ComponentLink6Description: https://datasheet.ciiva.com/28590/1678796-28590759.pdf?src-supplier=Element14; ComponentLink7URL: https://datasheet.ciiva.com/16760/70260739-16760549.pdf?src-supplier=Allied+Electronics; ComponentLink7Description: https://datasheet.ciiva.com/16760/70260739-16760549.pdf?src-supplier=Allied+Electronics; ComponentLink8URL: https://datasheet.ciiva.com/16781/70260739-16781851.pdf?src-supplier=Allied+Electronics; ComponentLink8Description: https://datasheet.ciiva.com/16781/70260739-16781851.pdf?src-supplier=Allied+Electronics; Supplier Part Number 1: P680JCT-ND
footprint RES_0402_RESC1005X04N (Chip Resistor, 2-Leads, Body 1.02x0.53mm, IPC Medium Density)
pins: 1, 2

## RES_715K_1%_100mW_0402
designator R?, comment RK73H1ETTP7153F  Tolerance: 1%  Resistance: 715K  Case/Package: 0402
Res Thick Film 0402 715K Ohm 1% 0.1W(1/10W) ±100ppm/C Pad SMD Automotive T/R; Manufacturer: KOA Speer; Power Rating: 63mW; Voltage Rating: 50V; Temperature Coefficient: 100ppm/°C; Supplier 1: Digi-Key; Manufacturer Part Number: RK73H1ETTP7153F; RoHS: Yes; Category: Chip SMD Resistors; Stock 1: 50316; Pricing 1: 1=0.1, 10=0.021, 50=0.0134, 100=0.0112, 500=0.00764, 1000=0.00658, 5000=0.00478 (USD); Case Code (Imperial): 0402; Case Code (Metric): 1005; Min Operating Temperature: -55°C; Max Operating Temperature: 155°C; Packaging: Tape and Reel; Package Quantity: 10000; Termination: SMD/SMT; Voltage Rating (DC): 50V; Series: RK73H; Construction: Rectangular; Length: 1mm; Width: 0.5mm; Height: 0.35mm; Depth: 0.5mm; Military Standard: Not; Lead Free: Lead Free; RoHS Compliant: Yes; ComponentLink1URL: https://datasheet.ciiva.com/5553/rk73h-5553480.pdf?src-supplier=Mouser; ComponentLink1Description: https://datasheet.ciiva.com/5553/rk73h-5553480.pdf?src-supplier=Mouser; Supplier Part Number 1: 2019-RK73H1ETTP7153FCT-ND
footprint RES_0402_RESC1005X04N (Chip Resistor, 2-Leads, Body 1.02x0.53mm, IPC Medium Density)
pins: 1, 2

## RES_732K_1%_100mW_0603
designator R?, comment Tolerance: 1%  Resistance: 732K  Case/Package: 0603  (hidden comment: ERJ-3EKF7323V)
RES SMD 732K OHM 1% 1/10W 0603; Manufacturer: Panasonic; Power Rating: 100mW; Voltage Rating: 75V; Temperature Coefficient: 100ppm/°C; Voltage Rating (DC): 50V; Supplier 1: Digikey; Manufacturer Part Number: ERJ-3EKF7323V; RoHS: Yes; Category: Chip SMD Resistors; Stock 1: 24230; Pricing 1: 1=0.1, 10=0.018, 50=0.0112, 100=0.0095, 500=0.00646, 1000=0.00558 (USD); Mount: Surface Mount; Case Code (Metric): 1608; Case Code (Imperial): 0603; Contact Plating: Tin; Min Operating Temperature: -55°C; Max Operating Temperature: 155°C; Packaging: Tape and Reel; Package Quantity: 1; Resistor Type: Thick Film; Number of Terminations: 2; Termination: SMD/SMT; Max Power Dissipation: 100mW; Features: Automotive AEC-Q200; Series: ERJ; Resistance Tolerance: 1%; Construction: Rectangular; Length: 1.6mm; Width: 0.8mm; Height: 0.022inch; Depth: 0.8mm; Reach SVHC Compliant: Yes; Lead Free: Contains Lead; RoHS Compliant: Yes; Military Standard: Not; ComponentLink1URL: https://datasheet.ciiva.com/22667/1678782-22667773.pdf?src-supplier=Element14; ComponentLink1Description: https://datasheet.ciiva.com/22667/1678782-22667773.pdf?src-supplier=Element14; ComponentLink2URL: https://datasheet.ciiva.com/24059/aoa0000ce2-24059071.pdf?src-supplier=Mouser; ComponentLink2Description: https://datasheet.ciiva.com/24059/aoa0000ce2-24059071.pdf?src-supplier=Mouser; ComponentLink3URL: https://datasheet.ciiva.com/22739/1678782-22739349.pdf?src-supplier=Element14; ComponentLink3Description: https://datasheet.ciiva.com/22739/1678782-22739349.pdf?src-supplier=Element14; Supplier Part Number 1: P732KHCT-ND
footprint RES_0603_RESC1608X04N (Chip Resistor, 2-Leads, Body 1.60x0.80mm, IPC Medium Density)
pins: 1, 2

## RES_750K_1%_100mW_0603
designator R?, comment Tolerance: 1%  Resistance: 750K  Case/Package: 0603  (hidden comment: AC0603FR-07750KL)
Res Thick Film 0603 750K Ohm 1% 0.1W(1/10W) ±100ppm/C Pad SMD Automotive T/R; Manufacturer: Yageo; Power Rating: 100mW; Voltage Rating: 50V; Temperature Coefficient: 100ppm/°C; Supplier 1: Digi-Key; Manufacturer Part Number: AC0603FR-07750KL; RoHS: Yes; Category: Chip SMD Resistors; Stock 1: 32194; Pricing 1: 1=0.1, 10=0.02, 50=0.0122, 100=0.0102, 500=0.00698, 1000=0.00601 (USD); Case Code (Imperial): 0603; Case Code (Metric): 1608; Min Operating Temperature: -55°C; Max Operating Temperature: 155°C; Packaging: Tape and Reel; Number of Terminations: 2; Termination: SMD/SMT; Max Power Dissipation: 100mW; Features: Moisture Resistant,Automotive AEC-Q200; Series: AC; Length: 0.063inch; Width: 0.8mm; Height: 0.022inch; Lead Free: Lead Free; RoHS Compliant: Yes; ComponentLink1URL: http://www.mouser.com/ds/2/447/yageodocoutput-1111992.pdf?src-supplier=Mouser; ComponentLink1Description: http://www.mouser.com/ds/2/447/yageodocoutput-1111992.pdf?src-supplier=Mouser; ComponentLink2URL: http://www.yageo.com/NewPortal/yageodocoutput?fileName=/pdf/R-Chip/PYu-AC_51_RoHS_L_6.pdf&src-supplier=Digi-Key; ComponentLink2Description: http://www.yageo.com/NewPortal/yageodocoutput?fileName=/pdf/R-Chip/PYu-AC_51_RoHS_L_6.pdf&src-supplier=Digi-Key; ComponentLink3URL: https://datasheet.octopart.com/AC0603FR-07750KL-Yageo-datasheet-151884373.pdf?src-supplier=Future+Electronics; ComponentLink3Description: https://datasheet.octopart.com/AC0603FR-07750KL-Yageo-datasheet-151884373.pdf?src-supplier=Future+Electronics; ComponentLink4URL: http://www.yageo.com/documents/recent/PYu-AC_51_RoHS_L_2.pdf?src-supplier=Future+Electronics; ComponentLink4Description: http://www.yageo.com/documents/recent/PYu-AC_51_RoHS_L_2.pdf?src-supplier=Future+Electronics; Supplier Part Number 1: 13-AC0603FR-07750KLCT-ND
footprint RES_0603_RESC1608X04N (Chip Resistor, 2-Leads, Body 1.60x0.80mm, IPC Medium Density)
pins: 1, 2

## RES_806R_1%_300mW_0603
designator R?, comment Power: 0.3W  Resistance: 806R  Tolerance: 1%  Packcage: 0603  (hidden comment: SDR03EZPF8060)
Resistor High Anti-Surge Thick Film 0603 806 Ohm 1% 3/10W ±100ppm/℃ Molded SMD Paper T/R; Manufacturer: Rohm; Manufacturer Part Number: SDR03EZPF8060; RoHS: No; Category: Chip SMD Resistors; Stock 1: 9772; Pricing 1: 1=0.17000, 10=0.14300, 100=0.05570, 1000=0.02333, 2500=0.02138 (USD); Supplier 1: Digi-Key; Supplier 2: Verical; Supplier 3: Digi-Key; Supplier Part Number 1: 511-SDR03EZPF8060CT-ND; Supplier Part Number 2: SDR03EZPF8060; Supplier Part Number 3: 511-SDR03EZPF8060TR-ND
footprint R0603
pins: 1, 2

## RES_GEN_0201
designator R?, comment value TBD  Tolerance: ?%  Case/Package: 0201  (hidden comment: RES_GEN_0402)  (no BOM)
Place holder for 0201 resister; Voltage Rating (DC): 50V; Number of Pins: 2; Case Code (Imperial): 0201; Case Code (Metric): 0603; Resistance: TBD; Voltage Rating: 50V; Termination: SMD/SMT; Length: 0.6; Height: 0.26mm; Width: 0.3mm; Depth: 0.26mm; Number of Terminations: 2; Working Voltage: 50V; Lead Pitch: 0.6mm; Mount: Surface Mount
pins: 1, 2

## RES_GEN_0402
designator R?  value TBD  Case/Package: 0402  Tolerance: ?%  (hidden comment: RES_GEN_0402)  (no BOM)
Place holder for 0402 resister; Voltage Rating (DC): 50V; Number of Pins: 2; Case Code (Imperial): 0402; Case Code (Metric): 1005; Resistance: TBD; Voltage Rating: 50V; Termination: SMD/SMT; Length: 1mm; Height: 0.35mm; Width: 0.02inch; Depth: 0.5mm; Number of Terminations: 2; Working Voltage: 50V; Lead Pitch: 0.2mm; Mount: Surface Mount
footprint RES_0402_RESC1005X04N (Chip Resistor, 2-Leads, Body 1.02x0.53mm, IPC Medium Density)
pins: 1, 2